# Altium footprint library IC_SMD_BGA.PCBLIB: 104 footprints (part 5 of 13) (continued)
## BGA80_484_S19 [mm] "BGA, 484-Leads, Body 19.0x19.0mm,  Pitch 0.80mm" (continued)
TopOverlay:
  circle w0.2: c-10.15,9.3 r0.2
  region: -8.6,9.6 -9.6,8.6 -9.6,9.6
  lines w0.2: -9.6,8.6 -8.6,9.6 ; -9.6,-9.6 9.6,-9.6 9.6,9.6 -9.6,9.6 -9.6,-9.6
Mechanical13:
  lines w0.1: -9.5,-9.5 9.5,-9.5 9.5,9.5 -9.5,9.5 -9.5,-9.5
3D body: height 1.5, standoff 0.35, extent -9.5,-9.5 9.5,9.5

## BGA80_529_S19 [mm]
height 1.9
pads (529):
  round 0.45 smd mask+0: A1(-8.8,8.8) A2(-8,8.8) A3(-7.2,8.8) A4(-6.4,8.8) A5(-5.6,8.8) A6(-4.8,8.8) A7(-4,8.8) A8(-3.2,8.8) A9(-2.4,8.8) A10(-1.6,8.8) A11(-0.8,8.8) A12(0,8.8) A13(0.8,8.8) A14(1.6,8.8) A15(2.4,8.8) A16(3.2,8.8) A17(4,8.8) A18(4.8,8.8) A19(5.6,8.8) A20(6.4,8.8) A21(7.2,8.8) A22(8,8.8) A23(8.8,8.8) AA1(-8.8,-7.2) AA2(-8,-7.2) AA3(-7.2,-7.2) AA4(-6.4,-7.2) AA5(-5.6,-7.2) AA6(-4.8,-7.2) AA7(-4,-7.2) AA8(-3.2,-7.2) AA9(-2.4,-7.2) AA10(-1.6,-7.2) AA11(-0.8,-7.2) AA12(0,-7.2) AA13(0.8,-7.2) AA14(1.6,-7.2) AA15(2.4,-7.2) AA16(3.2,-7.2) AA17(4,-7.2) AA18(4.8,-7.2) AA19(5.6,-7.2) AA20(6.4,-7.2) AA21(7.2,-7.2) AA22(8,-7.2) AA23(8.8,-7.2) AB1(-8.8,-8) AB2(-8,-8) AB3(-7.2,-8) AB4(-6.4,-8) AB5(-5.6,-8) AB6(-4.8,-8) AB7(-4,-8) AB8(-3.2,-8) AB9(-2.4,-8) AB10(-1.6,-8) AB11(-0.8,-8) AB12(0,-8) AB13(0.8,-8) AB14(1.6,-8) AB15(2.4,-8) AB16(3.2,-8) AB17(4,-8) AB18(4.8,-8) AB19(5.6,-8) AB20(6.4,-8) AB21(7.2,-8) AB22(8,-8) AB23(8.8,-8) AC1(-8.8,-8.8) AC2(-8,-8.8) AC3(-7.2,-8.8) AC4(-6.4,-8.8) AC5(-5.6,-8.8) AC6(-4.8,-8.8) AC7(-4,-8.8) AC8(-3.2,-8.8) AC9(-2.4,-8.8) AC10(-1.6,-8.8) AC11(-0.8,-8.8) AC12(0,-8.8) AC13(0.8,-8.8) AC14(1.6,-8.8) AC15(2.4,-8.8) AC16(3.2,-8.8) AC17(4,-8.8) AC18(4.8,-8.8) AC19(5.6,-8.8) AC20(6.4,-8.8) AC21(7.2,-8.8) AC22(8,-8.8) AC23(8.8,-8.8) B1(-8.8,8) B2(-8,8) B3(-7.2,8) B4(-6.4,8) B5(-5.6,8) B6(-4.8,8) B7(-4,8) B8(-3.2,8) B9(-2.4,8) B10(-1.6,8) B11(-0.8,8) B12(0,8) B13(0.8,8) B14(1.6,8) B15(2.4,8) B16(3.2,8) B17(4,8) B18(4.8,8) B19(5.6,8) B20(6.4,8) B21(7.2,8) B22(8,8) B23(8.8,8) C1(-8.8,7.2) C2(-8,7.2) C3(-7.2,7.2) C4(-6.4,7.2) C5(-5.6,7.2) C6(-4.8,7.2) C7(-4,7.2) C8(-3.2,7.2) C9(-2.4,7.2) C10(-1.6,7.2) C11(-0.8,7.2) C12(0,7.2) C13(0.8,7.2) C14(1.6,7.2) C15(2.4,7.2) C16(3.2,7.2) C17(4,7.2) C18(4.8,7.2) C19(5.6,7.2) C20(6.4,7.2) C21(7.2,7.2) C22(8,7.2) C23(8.8,7.2) D1(-8.8,6.4) D2(-8,6.4) D3(-7.2,6.4) D4(-6.4,6.4) D5(-5.6,6.4) D6(-4.8,6.4) D7(-4,6.4) D8(-3.2,6.4) D9(-2.4,6.4) D10(-1.6,6.4) D11(-0.8,6.4) D12(0,6.4) D13(0.8,6.4) D14(1.6,6.4) D15(2.4,6.4) D16(3.2,6.4) D17(4,6.4) D18(4.8,6.4) D19(5.6,6.4) D20(6.4,6.4) D21(7.2,6.4) D22(8,6.4) D23(8.8,6.4) E1(-8.8,5.6) E2(-8,5.6) E3(-7.2,5.6) E4(-6.4,5.6) E5(-5.6,5.6) E6(-4.8,5.6) E7(-4,5.6) E8(-3.2,5.6) E9(-2.4,5.6) E10(-1.6,5.6) E11(-0.8,5.6) E12(0,5.6) E13(0.8,5.6) E14(1.6,5.6) E15(2.4,5.6) E16(3.2,5.6) E17(4,5.6) E18(4.8,5.6) E19(5.6,5.6) E20(6.4,5.6) E21(7.2,5.6) E22(8,5.6) E23(8.8,5.6) F1(-8.8,4.8) F2(-8,4.8) F3(-7.2,4.8) F4(-6.4,4.8) F5(-5.6,4.8) F6(-4.8,4.8) F7(-4,4.8) F8(-3.2,4.8) F9(-2.4,4.8) F10(-1.6,4.8) F11(-0.8,4.8) F12(0,4.8) F13(0.8,4.8) F14(1.6,4.8) F15(2.4,4.8) F16(3.2,4.8) F17(4,4.8) F18(4.8,4.8) F19(5.6,4.8) F20(6.4,4.8) F21(7.2,4.8) F22(8,4.8) F23(8.8,4.8) G1(-8.8,4) G2(-8,4) G3(-7.2,4) G4(-6.4,4) G5(-5.6,4) G6(-4.8,4) G7(-4,4) G8(-3.2,4) G9(-2.4,4) G10(-1.6,4) G11(-0.8,4) G12(0,4) G13(0.8,4) G14(1.6,4) G15(2.4,4) G16(3.2,4) G17(4,4) G18(4.8,4) G19(5.6,4) G20(6.4,4) G21(7.2,4) G22(8,4) G23(8.8,4) H1(-8.8,3.2) H2(-8,3.2) H3(-7.2,3.2) H4(-6.4,3.2) H5(-5.6,3.2) H6(-4.8,3.2) H7(-4,3.2) H8(-3.2,3.2) H9(-2.4,3.2) H10(-1.6,3.2) H11(-0.8,3.2) H12(0,3.2) H13(0.8,3.2) H14(1.6,3.2) H15(2.4,3.2) H16(3.2,3.2) H17(4,3.2) H18(4.8,3.2) H19(5.6,3.2) H20(6.4,3.2) H21(7.2,3.2) H22(8,3.2) H23(8.8,3.2) J1(-8.8,2.4) J2(-8,2.4) J3(-7.2,2.4) J4(-6.4,2.4) J5(-5.6,2.4) J6(-4.8,2.4) J7(-4,2.4) J8(-3.2,2.4) J9(-2.4,2.4) J10(-1.6,2.4) J11(-0.8,2.4) J12(0,2.4) J13(0.8,2.4) J14(1.6,2.4) J15(2.4,2.4) J16(3.2,2.4) J17(4,2.4) J18(4.8,2.4) J19(5.6,2.4) J20(6.4,2.4) J21(7.2,2.4) J22(8,2.4) J23(8.8,2.4) K1(-8.8,1.6) K2(-8,1.6) K3(-7.2,1.6) K4(-6.4,1.6) K5(-5.6,1.6) K6(-4.8,1.6) K7(-4,1.6) K8(-3.2,1.6) K9(-2.4,1.6) K10(-1.6,1.6) K11(-0.8,1.6) K12(0,1.6) K13(0.8,1.6) K14(1.6,1.6) K15(2.4,1.6) K16(3.2,1.6) K17(4,1.6) K18(4.8,1.6) K19(5.6,1.6) K20(6.4,1.6) K21(7.2,1.6) K22(8,1.6) K23(8.8,1.6) L1(-8.8,0.8) L2(-8,0.8) L3(-7.2,0.8) L4(-6.4,0.8) L5(-5.6,0.8) L6(-4.8,0.8) L7(-4,0.8) L8(-3.2,0.8) L9(-2.4,0.8) L10(-1.6,0.8) L11(-0.8,0.8) L12(0,0.8) L13(0.8,0.8) L14(1.6,0.8) L15(2.4,0.8) L16(3.2,0.8) L17(4,0.8) L18(4.8,0.8) L19(5.6,0.8) L20(6.4,0.8) L21(7.2,0.8) L22(8,0.8) L23(8.8,0.8) M1(-8.8,0) M2(-8,0) M3(-7.2,0) M4(-6.4,0) M5(-5.6,0) M6(-4.8,0) M7(-4,0) M8(-3.2,0) M9(-2.4,0) M10(-1.6,0) M11(-0.8,0) M12(0,0) M13(0.8,0) M14(1.6,0) M15(2.4,0) M16(3.2,0) M17(4,0) M18(4.8,0) M19(5.6,0) M20(6.4,0) M21(7.2,0) M22(8,0) M23(8.8,0) N1(-8.8,-0.8) N2(-8,-0.8) N3(-7.2,-0.8) N4(-6.4,-0.8) N5(-5.6,-0.8) N6(-4.8,-0.8) N7(-4,-0.8) N8(-3.2,-0.8) N9(-2.4,-0.8) N10(-1.6,-0.8) N11(-0.8,-0.8) N12(0,-0.8) N13(0.8,-0.8) N14(1.6,-0.8) N15(2.4,-0.8) N16(3.2,-0.8) N17(4,-0.8) N18(4.8,-0.8) N19(5.6,-0.8) N20(6.4,-0.8) N21(7.2,-0.8) N22(8,-0.8) N23(8.8,-0.8) P1(-8.8,-1.6) P2(-8,-1.6) P3(-7.2,-1.6) P4(-6.4,-1.6) P5(-5.6,-1.6) P6(-4.8,-1.6) P7(-4,-1.6) P8(-3.2,-1.6) P9(-2.4,-1.6) P10(-1.6,-1.6) P11(-0.8,-1.6) P12(0,-1.6) P13(0.8,-1.6) P14(1.6,-1.6) P15(2.4,-1.6) P16(3.2,-1.6) P17(4,-1.6) P18(4.8,-1.6) P19(5.6,-1.6) P20(6.4,-1.6) P21(7.2,-1.6) P22(8,-1.6) P23(8.8,-1.6) R1(-8.8,-2.4) R2(-8,-2.4) R3(-7.2,-2.4) R4(-6.4,-2.4) R5(-5.6,-2.4) R6(-4.8,-2.4) R7(-4,-2.4) R8(-3.2,-2.4) R9(-2.4,-2.4) R10(-1.6,-2.4) R11(-0.8,-2.4) R12(0,-2.4) R13(0.8,-2.4) R14(1.6,-2.4) R15(2.4,-2.4) R16(3.2,-2.4) R17(4,-2.4) R18(4.8,-2.4) R19(5.6,-2.4) R20(6.4,-2.4) R21(7.2,-2.4) R22(8,-2.4) R23(8.8,-2.4) T1(-8.8,-3.2) T2(-8,-3.2) T3(-7.2,-3.2) T4(-6.4,-3.2) T5(-5.6,-3.2) T6(-4.8,-3.2) T7(-4,-3.2) T8(-3.2,-3.2) T9(-2.4,-3.2) T10(-1.6,-3.2) T11(-0.8,-3.2) T12(0,-3.2) T13(0.8,-3.2) T14(1.6,-3.2) T15(2.4,-3.2) T16(3.2,-3.2) T17(4,-3.2) T18(4.8,-3.2) T19(5.6,-3.2) T20(6.4,-3.2) T21(7.2,-3.2) T22(8,-3.2) T23(8.8,-3.2) U1(-8.8,-4) U2(-8,-4) U3(-7.2,-4) U4(-6.4,-4) U5(-5.6,-4) U6(-4.8,-4) U7(-4,-4) U8(-3.2,-4) U9(-2.4,-4) U10(-1.6,-4) U11(-0.8,-4) U12(0,-4) U13(0.8,-4) U14(1.6,-4) U15(2.4,-4) U16(3.2,-4) U17(4,-4) U18(4.8,-4) U19(5.6,-4) U20(6.4,-4) U21(7.2,-4) U22(8,-4) U23(8.8,-4) V1(-8.8,-4.8) V2(-8,-4.8) V3(-7.2,-4.8) V4(-6.4,-4.8) V5(-5.6,-4.8) V6(-4.8,-4.8) V7(-4,-4.8) V8(-3.2,-4.8) V9(-2.4,-4.8) V10(-1.6,-4.8) V11(-0.8,-4.8) V12(0,-4.8) V13(0.8,-4.8) V14(1.6,-4.8) V15(2.4,-4.8) V16(3.2,-4.8) V17(4,-4.8) V18(4.8,-4.8) V19(5.6,-4.8) V20(6.4,-4.8) V21(7.2,-4.8) V22(8,-4.8) V23(8.8,-4.8) W1(-8.8,-5.6) W2(-8,-5.6) W3(-7.2,-5.6) W4(-6.4,-5.6) W5(-5.6,-5.6) W6(-4.8,-5.6) W7(-4,-5.6) W8(-3.2,-5.6) W9(-2.4,-5.6) W10(-1.6,-5.6) W11(-0.8,-5.6) W12(0,-5.6) W13(0.8,-5.6) W14(1.6,-5.6) W15(2.4,-5.6) W16(3.2,-5.6) W17(4,-5.6) W18(4.8,-5.6) W19(5.6,-5.6) W20(6.4,-5.6) W21(7.2,-5.6) W22(8,-5.6) W23(8.8,-5.6) Y1(-8.8,-6.4) Y2(-8,-6.4) Y3(-7.2,-6.4) Y4(-6.4,-6.4) Y5(-5.6,-6.4) Y6(-4.8,-6.4) Y7(-4,-6.4) Y8(-3.2,-6.4) Y9(-2.4,-6.4) Y10(-1.6,-6.4) Y11(-0.8,-6.4) Y12(0,-6.4) Y13(0.8,-6.4) Y14(1.6,-6.4) Y15(2.4,-6.4) Y16(3.2,-6.4) Y17(4,-6.4) Y18(4.8,-6.4) Y19(5.6,-6.4) Y20(6.4,-6.4) Y21(7.2,-6.4) Y22(8,-6.4) Y23(8.8,-6.4)
TopOverlay:
  circle w0.25: c-10.25,8.8 r0.125
  region: -8.884,9.6 -9.6,8.884 -9.6,9.6
  lines w0.2: -9.6,8.884 -8.884,9.6 ; -9.6,-9.6 -9.6,9.6 9.6,9.6 9.6,-9.6 -9.6,-9.6
Mechanical13:
  lines w0.1: -9.5,-9.5 -9.5,9.5 9.5,9.5 9.5,-9.5 -9.5,-9.5
3D body: height 1.9, standoff 0.2, extent -9.5,-9.5 9.5,9.5

## BGA80_697_S24 [mm] "ZTZ GTZ PBGA N697"
height 3.2
pads (697):
  round 0.45 smd: A1(-11.2,11.2) A2(-10.4,11.2) A3(-9.6,11.2) A4(-8.8,11.2) A5(-8,11.2) A6(-7.2,11.2) A7(-6.4,11.2) A8(-5.6,11.2) A9(-4.8,11.2) A10(-4,11.2) A11(-3.2,11.2) A12(-2.4,11.2) A13(-1.6,11.2) A14(-0.8,11.2) A15(0,11.2) A16(0.8,11.2) A17(1.6,11.2) A18(2.4,11.2) A19(3.2,11.2) A20(4,11.2) A21(4.8,11.2) A22(5.6,11.2) A23(6.4,11.2) A24(7.2,11.2) A25(8,11.2) A26(8.8,11.2) A27(9.6,11.2) A28(10.4,11.2) A29(11.2,11.2) AA1(-11.2,-4.8) AA2(-10.4,-4.8) AA3(-9.6,-4.8) AA4(-8.8,-4.8) AA5(-8,-4.8) AA6(-7.2,-4.8) AA7(-6.4,-4.8) AA23(6.4,-4.8) AA24(7.2,-4.8) AA25(8,-4.8) AA26(8.8,-4.8) AA27(9.6,-4.8) AA28(10.4,-4.8) AA29(11.2,-4.8) AB1(-11.2,-5.6) AB2(-10.4,-5.6) AB3(-9.6,-5.6) AB4(-8.8,-5.6) AB5(-8,-5.6) AB6(-7.2,-5.6) AB7(-6.4,-5.6) AB23(6.4,-5.6) AB24(7.2,-5.6) AB25(8,-5.6) AB26(8.8,-5.6) AB27(9.6,-5.6) AB28(10.4,-5.6) AB29(11.2,-5.6) AC1(-11.2,-6.4) AC2(-10.4,-6.4) AC3(-9.6,-6.4) AC4(-8.8,-6.4) AC5(-8,-6.4) AC6(-7.2,-6.4) AC7(-6.4,-6.4) AC8(-5.6,-6.4) AC9(-4.8,-6.4) AC10(-4,-6.4) AC11(-3.2,-6.4) AC12(-2.4,-6.4) AC13(-1.6,-6.4) AC14(-0.8,-6.4) AC15(0,-6.4) AC16(0.8,-6.4) AC17(1.6,-6.4) AC18(2.4,-6.4) AC19(3.2,-6.4) AC20(4,-6.4) AC21(4.8,-6.4) AC22(5.6,-6.4) AC23(6.4,-6.4) AC24(7.2,-6.4) AC25(8,-6.4) AC26(8.8,-6.4) AC27(9.6,-6.4) AC28(10.4,-6.4) AC29(11.2,-6.4) AD1(-11.2,-7.2) AD2(-10.4,-7.2) AD3(-9.6,-7.2) AD4(-8.8,-7.2) AD5(-8,-7.2) AD6(-7.2,-7.2) AD7(-6.4,-7.2) AD8(-5.6,-7.2) AD9(-4.8,-7.2) AD10(-4,-7.2) AD11(-3.2,-7.2) AD12(-2.4,-7.2) AD13(-1.6,-7.2) AD14(-0.8,-7.2) AD15(0,-7.2) AD16(0.8,-7.2) AD17(1.6,-7.2) AD18(2.4,-7.2) AD19(3.2,-7.2) AD20(4,-7.2) AD21(4.8,-7.2) AD22(5.6,-7.2) AD23(6.4,-7.2) AD24(7.2,-7.2) AD25(8,-7.2) AD26(8.8,-7.2) AD27(9.6,-7.2) AD28(10.4,-7.2) AD29(11.2,-7.2) AE1(-11.2,-8) AE2(-10.4,-8) AE3(-9.6,-8) AE4(-8.8,-8) AE5(-8,-8) AE6(-7.2,-8) AE7(-6.4,-8) AE8(-5.6,-8) AE9(-4.8,-8) AE10(-4,-8) AE11(-3.2,-8) AE12(-2.4,-8) AE13(-1.6,-8) AE14(-0.8,-8) AE15(0,-8) AE16(0.8,-8) AE17(1.6,-8) AE18(2.4,-8) AE19(3.2,-8) AE20(4,-8) AE21(4.8,-8) AE22(5.6,-8) AE23(6.4,-8) AE24(7.2,-8) AE25(8,-8) AE26(8.8,-8) AE27(9.6,-8) AE28(10.4,-8) AE29(11.2,-8) AF1(-11.2,-8.8) AF2(-10.4,-8.8) AF3(-9.6,-8.8) AF4(-8.8,-8.8) AF5(-8,-8.8) AF6(-7.2,-8.8) AF7(-6.4,-8.8) AF8(-5.6,-8.8) AF9(-4.8,-8.8) AF10(-4,-8.8) AF11(-3.2,-8.8) AF12(-2.4,-8.8) AF13(-1.6,-8.8) AF14(-0.8,-8.8) AF15(0,-8.8) AF16(0.8,-8.8) AF17(1.6,-8.8) AF18(2.4,-8.8) AF19(3.2,-8.8) AF20(4,-8.8) AF21(4.8,-8.8) AF22(5.6,-8.8) AF23(6.4,-8.8) AF24(7.2,-8.8) AF25(8,-8.8) AF26(8.8,-8.8) AF27(9.6,-8.8) AF28(10.4,-8.8) AF29(11.2,-8.8) AG1(-11.2,-9.6) AG2(-10.4,-9.6) AG3(-9.6,-9.6) AG4(-8.8,-9.6) AG5(-8,-9.6) AG6(-7.2,-9.6) AG7(-6.4,-9.6) AG8(-5.6,-9.6) AG9(-4.8,-9.6) AG10(-4,-9.6) AG11(-3.2,-9.6) AG12(-2.4,-9.6) AG13(-1.6,-9.6) AG14(-0.8,-9.6) AG15(0,-9.6) AG16(0.8,-9.6) AG17(1.6,-9.6) AG18(2.4,-9.6) AG19(3.2,-9.6) AG20(4,-9.6) AG21(4.8,-9.6) AG22(5.6,-9.6) AG23(6.4,-9.6) AG24(7.2,-9.6) AG25(8,-9.6) AG26(8.8,-9.6) AG27(9.6,-9.6) AG28(10.4,-9.6) AG29(11.2,-9.6) AH1(-11.2,-10.4) AH2(-10.4,-10.4) AH3(-9.6,-10.4) AH4(-8.8,-10.4) AH5(-8,-10.4) AH6(-7.2,-10.4) AH7(-6.4,-10.4) AH8(-5.6,-10.4) AH9(-4.8,-10.4) AH10(-4,-10.4) AH11(-3.2,-10.4) AH12(-2.4,-10.4) AH13(-1.6,-10.4) AH14(-0.8,-10.4) AH15(0,-10.4) AH16(0.8,-10.4) AH17(1.6,-10.4) AH18(2.4,-10.4) AH19(3.2,-10.4) AH20(4,-10.4) AH21(4.8,-10.4) AH22(5.6,-10.4) AH23(6.4,-10.4) AH24(7.2,-10.4) AH25(8,-10.4) AH26(8.8,-10.4) AH27(9.6,-10.4) AH28(10.4,-10.4) AH29(11.2,-10.4) AJ1(-11.2,-11.2) AJ2(-10.4,-11.2) AJ3(-9.6,-11.2) AJ4(-8.8,-11.2) AJ5(-8,-11.2) AJ6(-7.2,-11.2) AJ7(-6.4,-11.2) AJ8(-5.6,-11.2) AJ9(-4.8,-11.2) AJ10(-4,-11.2) AJ11(-3.2,-11.2) AJ12(-2.4,-11.2) AJ13(-1.6,-11.2) AJ14(-0.8,-11.2) AJ15(0,-11.2) AJ16(0.8,-11.2) AJ17(1.6,-11.2) AJ18(2.4,-11.2) AJ19(3.2,-11.2) AJ20(4,-11.2) AJ21(4.8,-11.2) AJ22(5.6,-11.2) AJ23(6.4,-11.2) AJ24(7.2,-11.2) AJ25(8,-11.2) AJ26(8.8,-11.2) AJ27(9.6,-11.2) AJ28(10.4,-11.2) AJ29(11.2,-11.2) B1(-11.2,10.4) B2(-10.4,10.4) B3(-9.6,10.4) B4(-8.8,10.4) B5(-8,10.4) B6(-7.2,10.4) B7(-6.4,10.4) B8(-5.6,10.4) B9(-4.8,10.4) B10(-4,10.4) B11(-3.2,10.4) B12(-2.4,10.4) B13(-1.6,10.4) B14(-0.8,10.4) B15(0,10.4) B16(0.8,10.4) B17(1.6,10.4) B18(2.4,10.4) B19(3.2,10.4) B20(4,10.4) B21(4.8,10.4) B22(5.6,10.4) B23(6.4,10.4) B24(7.2,10.4) B25(8,10.4) B26(8.8,10.4) B27(9.6,10.4) B28(10.4,10.4) B29(11.2,10.4) C1(-11.2,9.6) C2(-10.4,9.6) C3(-9.6,9.6) C4(-8.8,9.6) C5(-8,9.6) C6(-7.2,9.6) C7(-6.4,9.6) C8(-5.6,9.6) C9(-4.8,9.6) C10(-4,9.6) C11(-3.2,9.6) C12(-2.4,9.6) C13(-1.6,9.6) C14(-0.8,9.6) C15(0,9.6) C16(0.8,9.6) C17(1.6,9.6) C18(2.4,9.6) C19(3.2,9.6) C20(4,9.6) C21(4.8,9.6) C22(5.6,9.6) C23(6.4,9.6) C24(7.2,9.6) C25(8,9.6) C26(8.8,9.6) C27(9.6,9.6) C28(10.4,9.6) C29(11.2,9.6) D1(-11.2,8.8) D2(-10.4,8.8) D3(-9.6,8.8) D4(-8.8,8.8) D5(-8,8.8) D6(-7.2,8.8) D7(-6.4,8.8) D8(-5.6,8.8) D9(-4.8,8.8) D10(-4,8.8) D11(-3.2,8.8) D12(-2.4,8.8) D13(-1.6,8.8) D14(-0.8,8.8) D15(0,8.8) D16(0.8,8.8) D17(1.6,8.8) D18(2.4,8.8) D19(3.2,8.8) D20(4,8.8) D21(4.8,8.8) D22(5.6,8.8) D23(6.4,8.8) D24(7.2,8.8) D25(8,8.8) D26(8.8,8.8) D27(9.6,8.8) D28(10.4,8.8) D29(11.2,8.8) E1(-11.2,8) E2(-10.4,8) E3(-9.6,8) E4(-8.8,8) E5(-8,8) E6(-7.2,8) E7(-6.4,8) E8(-5.6,8) E9(-4.8,8) E10(-4,8) E11(-3.2,8) E12(-2.4,8) E13(-1.6,8) E14(-0.8,8) E15(0,8) E16(0.8,8) E17(1.6,8) E18(2.4,8) E19(3.2,8) E20(4,8) E21(4.8,8) E22(5.6,8) E23(6.4,8) E24(7.2,8) E25(8,8) E26(8.8,8) E27(9.6,8) E28(10.4,8) E29(11.2,8) F1(-11.2,7.2) F2(-10.4,7.2) F3(-9.6,7.2) F4(-8.8,7.2) F5(-8,7.2) F6(-7.2,7.2) F7(-6.4,7.2) F8(-5.6,7.2) F9(-4.8,7.2) F10(-4,7.2) F11(-3.2,7.2) F12(-2.4,7.2) F13(-1.6,7.2) F14(-0.8,7.2) F15(0,7.2) F16(0.8,7.2) F17(1.6,7.2) F18(2.4,7.2) F19(3.2,7.2) F20(4,7.2) F21(4.8,7.2) F22(5.6,7.2) F23(6.4,7.2) F24(7.2,7.2) F25(8,7.2) F26(8.8,7.2) F27(9.6,7.2) F28(10.4,7.2) F29(11.2,7.2) G1(-11.2,6.4) G2(-10.4,6.4) G3(-9.6,6.4) G4(-8.8,6.4) G5(-8,6.4) G6(-7.2,6.4) G7(-6.4,6.4) G8(-5.6,6.4) G9(-4.8,6.4) G10(-4,6.4) G11(-3.2,6.4) G12(-2.4,6.4) G13(-1.6,6.4) G14(-0.8,6.4) G15(0,6.4) G16(0.8,6.4) G17(1.6,6.4) G18(2.4,6.4) G19(3.2,6.4) G20(4,6.4) G21(4.8,6.4) G22(5.6,6.4) G23(6.4,6.4) G24(7.2,6.4) G25(8,6.4) G26(8.8,6.4) G27(9.6,6.4) G28(10.4,6.4) G29(11.2,6.4) H1(-11.2,5.6) H2(-10.4,5.6) H3(-9.6,5.6) H4(-8.8,5.6) H5(-8,5.6) H6(-7.2,5.6) H7(-6.4,5.6) H23(6.4,5.6) H24(7.2,5.6) H25(8,5.6) H26(8.8,5.6) H27(9.6,5.6) H28(10.4,5.6) H29(11.2,5.6) J1(-11.2,4.8) J2(-10.4,4.8) J3(-9.6,4.8) J4(-8.8,4.8) J5(-8,4.8) J6(-7.2,4.8) J7(-6.4,4.8) J23(6.4,4.8) J24(7.2,4.8) J25(8,4.8) J26(8.8,4.8) J27(9.6,4.8) J28(10.4,4.8) J29(11.2,4.8) K1(-11.2,4) K2(-10.4,4) K3(-9.6,4) K4(-8.8,4) K5(-8,4) K6(-7.2,4) K7(-6.4,4) K23(6.4,4) K24(7.2,4) K25(8,4) K26(8.8,4) K27(9.6,4) K28(10.4,4) K29(11.2,4) L1(-11.2,3.2) L2(-10.4,3.2) L3(-9.6,3.2) L4(-8.8,3.2) L5(-8,3.2) L6(-7.2,3.2) L7(-6.4,3.2) L11(-3.2,3.2) L12(-2.4,3.2) L13(-1.6,3.2) L14(-0.8,3.2) L15(0,3.2) L16(0.8,3.2) L17(1.6,3.2) L18(2.4,3.2) L19(3.2,3.2) L23(6.4,3.2) L24(7.2,3.2) L25(8,3.2) L26(8.8,3.2) L27(9.6,3.2) L28(10.4,3.2) L29(11.2,3.2) M1(-11.2,2.4) M2(-10.4,2.4) M3(-9.6,2.4) M4(-8.8,2.4) M5(-8,2.4) M6(-7.2,2.4) M7(-6.4,2.4) M11(-3.2,2.4) M12(-2.4,2.4) M13(-1.6,2.4) M14(-0.8,2.4) M15(0,2.4) M16(0.8,2.4) M17(1.6,2.4) M18(2.4,2.4) M19(3.2,2.4) M23(6.4,2.4) M24(7.2,2.4) M25(8,2.4) M26(8.8,2.4) M27(9.6,2.4) M28(10.4,2.4) M29(11.2,2.4) N1(-11.2,1.6) N2(-10.4,1.6) N3(-9.6,1.6) N4(-8.8,1.6) N5(-8,1.6) N6(-7.2,1.6) N7(-6.4,1.6) N11(-3.2,1.6) N12(-2.4,1.6) N13(-1.6,1.6) N14(-0.8,1.6) N15(0,1.6) N16(0.8,1.6) N17(1.6,1.6) N18(2.4,1.6) N19(3.2,1.6) N23(6.4,1.6) N24(7.2,1.6) N25(8,1.6) N26(8.8,1.6) N27(9.6,1.6) N28(10.4,1.6) N29(11.2,1.6) P1(-11.2,0.8) P2(-10.4,0.8) P3(-9.6,0.8) P4(-8.8,0.8) P5(-8,0.8) P6(-7.2,0.8) P7(-6.4,0.8) P11(-3.2,0.8) P12(-2.4,0.8) P13(-1.6,0.8) P14(-0.8,0.8) P15(0,0.8) P16(0.8,0.8) P17(1.6,0.8) P18(2.4,0.8) P19(3.2,0.8) P23(6.4,0.8) P24(7.2,0.8) P25(8,0.8) P26(8.8,0.8) P27(9.6,0.8) P28(10.4,0.8) P29(11.2,0.8) R1(-11.2,0) R2(-10.4,0) R3(-9.6,0) R4(-8.8,0) R5(-8,0) R6(-7.2,0) R7(-6.4,0) R11(-3.2,0) R12(-2.4,0) R13(-1.6,0) R14(-0.8,0) R15(0,0) R16(0.8,0) R17(1.6,0) R18(2.4,0) R19(3.2,0) R23(6.4,0) R24(7.2,0) R25(8,0) R26(8.8,0) R27(9.6,0) R28(10.4,0) R29(11.2,0) T1(-11.2,-0.8) T2(-10.4,-0.8) T3(-9.6,-0.8) T4(-8.8,-0.8) T5(-8,-0.8) T6(-7.2,-0.8) T7(-6.4,-0.8) T11(-3.2,-0.8) T12(-2.4,-0.8) T13(-1.6,-0.8) T14(-0.8,-0.8) T15(0,-0.8) T16(0.8,-0.8) T17(1.6,-0.8) T18(2.4,-0.8) T19(3.2,-0.8) T23(6.4,-0.8) T24(7.2,-0.8) T25(8,-0.8) T26(8.8,-0.8) T27(9.6,-0.8) T28(10.4,-0.8) T29(11.2,-0.8) U1(-11.2,-1.6) U2(-10.4,-1.6) U3(-9.6,-1.6) U4(-8.8,-1.6) U5(-8,-1.6) U6(-7.2,-1.6) U7(-6.4,-1.6) U11(-3.2,-1.6) U12(-2.4,-1.6) U13(-1.6,-1.6) U14(-0.8,-1.6) U15(0,-1.6) U16(0.8,-1.6) U17(1.6,-1.6) U18(2.4,-1.6) U19(3.2,-1.6) U23(6.4,-1.6) U24(7.2,-1.6) U25(8,-1.6) U26(8.8,-1.6) U27(9.6,-1.6) U28(10.4,-1.6) U29(11.2,-1.6) V1(-11.2,-2.4) V2(-10.4,-2.4) V3(-9.6,-2.4) V4(-8.8,-2.4) V5(-8,-2.4) V6(-7.2,-2.4) V7(-6.4,-2.4) V11(-3.2,-2.4) V12(-2.4,-2.4) V13(-1.6,-2.4) V14(-0.8,-2.4) V15(0,-2.4) V16(0.8,-2.4) V17(1.6,-2.4) V18(2.4,-2.4) V19(3.2,-2.4) V23(6.4,-2.4) V24(7.2,-2.4) V25(8,-2.4) V26(8.8,-2.4) V27(9.6,-2.4) V28(10.4,-2.4) V29(11.2,-2.4) W1(-11.2,-3.2) W2(-10.4,-3.2) W3(-9.6,-3.2) W4(-8.8,-3.2) W5(-8,-3.2) W6(-7.2,-3.2) W7(-6.4,-3.2) W11(-3.2,-3.2) W12(-2.4,-3.2) W13(-1.6,-3.2) W14(-0.8,-3.2) W15(0,-3.2) W16(0.8,-3.2) W17(1.6,-3.2) W18(2.4,-3.2) W19(3.2,-3.2) W23(6.4,-3.2) W24(7.2,-3.2) W25(8,-3.2) W26(8.8,-3.2) W27(9.6,-3.2) W28(10.4,-3.2) W29(11.2,-3.2) Y1(-11.2,-4) Y2(-10.4,-4) Y3(-9.6,-4) Y4(-8.8,-4) Y5(-8,-4) Y6(-7.2,-4) Y7(-6.4,-4) Y23(6.4,-4) Y24(7.2,-4) Y25(8,-4) Y26(8.8,-4) Y27(9.6,-4) Y28(10.4,-4) Y29(11.2,-4)
TopOverlay:
  circle w0.2: c-12.5,11.8 r0.2
  region: -11.284,12 -12,11.284 -12,12
  lines w0.2: -12,11.284 -11.284,12 ; -12.1,-12.1 -12.1,12.1 12.1,12.1 12.1,-12.1 -12.1,-12.1
Mechanical13:
  lines w0.1: -12,-12 -12,12 12,12 12,-12 -12,-12
3D body: height 3.2, standoff 0.35, extent -12,-12 12,12